# Altium footprint library CapacitorsTHD.PcbLib: 46 footprints (part 1 of 3)
Each footprint in its own frame and in the unit in brackets; x right, y up, seen from the top. Pads: shape width x height; smd on the part's side, far side on the other; paste and mask are expansions set on the pad; w line width, h text height; cw(c..) or ccw(c..) is an arc to the next point about the centre after c.
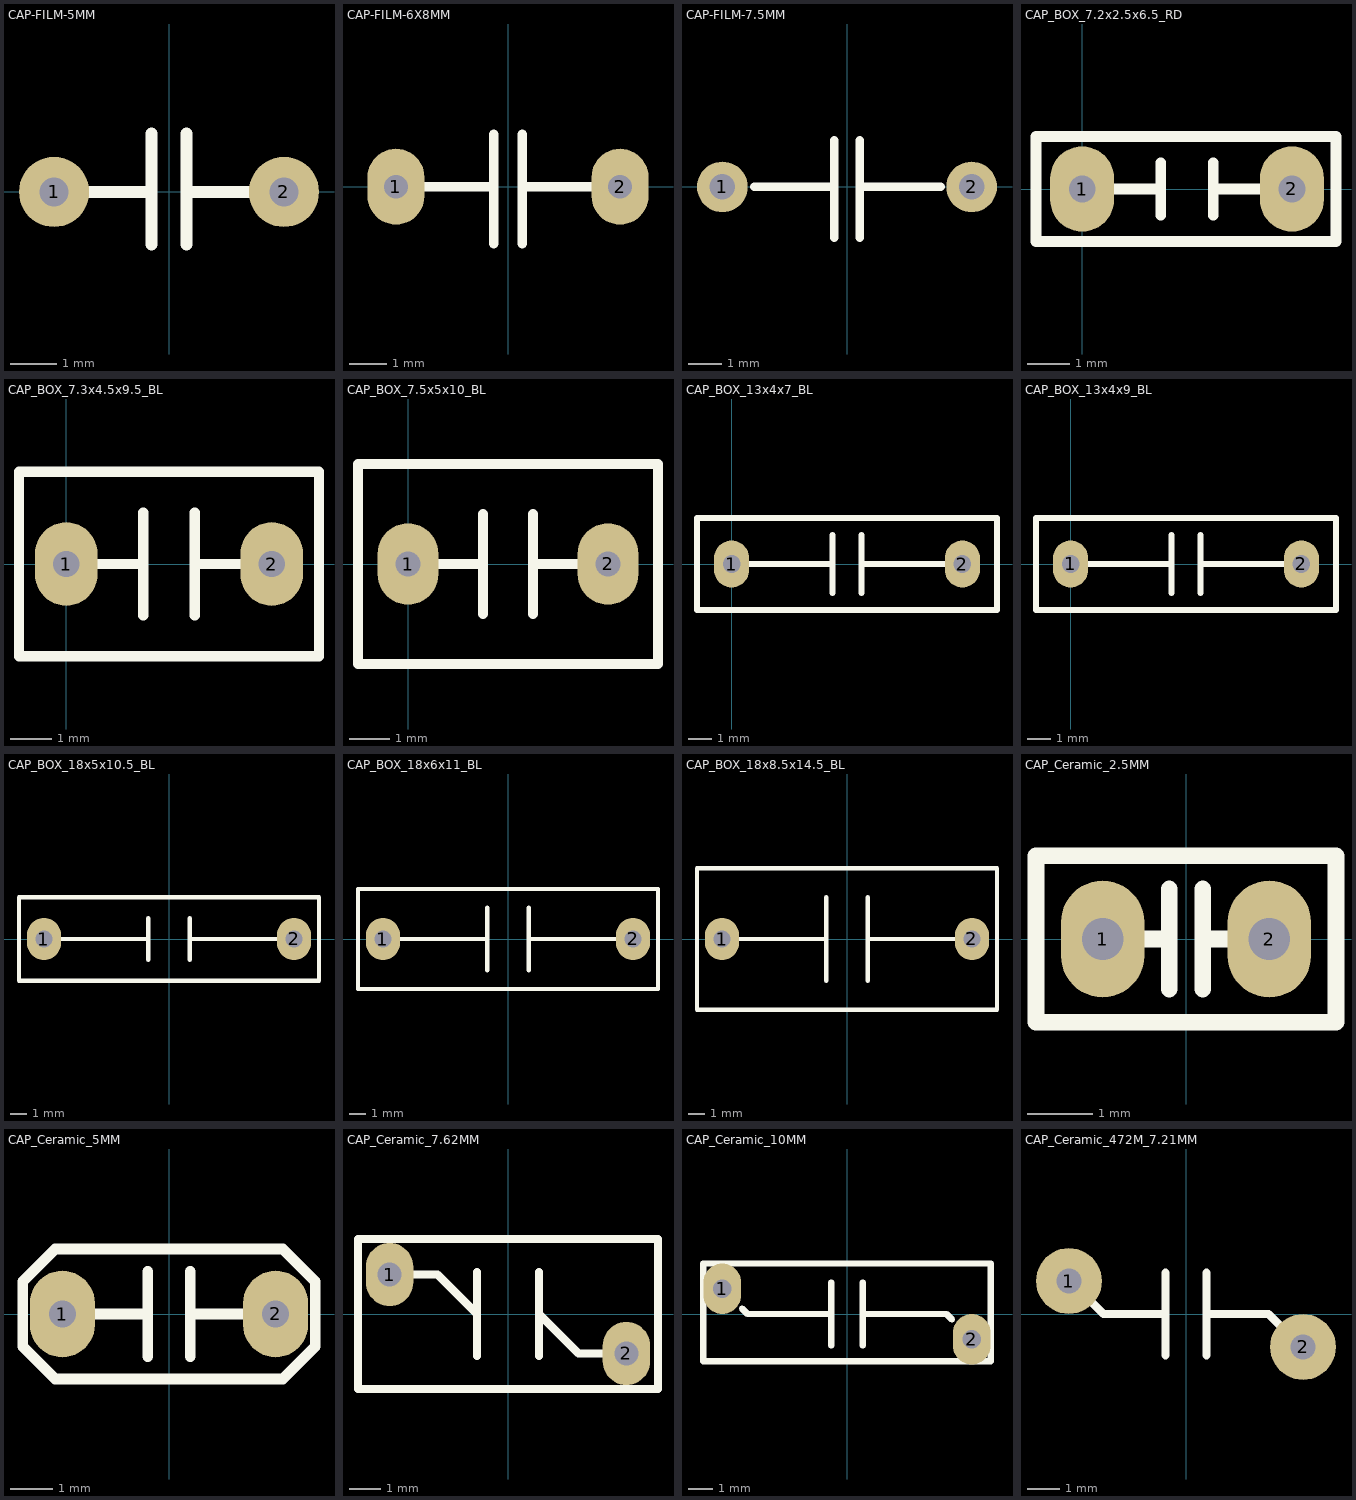
[diagram p0: the footprints below, top view; thin cyan lines are the x and y axes]

## CAP-FILM-5MM [mil]
pads (2):
  round 60 hole 25: 1(-98.43,0) 2(98.43,0)
Top Overlay:
  lines w10: -90,0 -20,0 ; -15,-45 -15,50 ; 15,-45 15,50 ; 20,0 90,0
3D body "102J.STEP": height 463.39, standoff -343.7, extent -127.95,-58.89 127.95,58.88

## CAP-FILM-6X8MM [mil]
pads (2):
  oval 60x80 hole 25: 1(-118,0) 2(118,0)
Top Overlay:
  lines w10: -90,0 -20,0 ; -15,-60 -15,55 ; 15,-60 15,55 ; 20,0 90,0
3D body "User Library-Film Capacitor 6x8mm.STEP": height 522.33, standoff -146.16, extent -157.48,-80 157.48,77.48

## CAP-FILM-7.5MM [mil]
pads (2):
  round 60 hole 30: 1(-147.64,0) 2(147.64,0)
Top Overlay:
  lines w10: -110,0 -20,0 ; -15,-60 -15,55 ; 15,-60 15,55 ; 20,0 111,0
3D body "473J.STEP": height 520, standoff -346.14, extent -206.69,-118.1 206.7,118.12

## CAP_BOX_7.2x2.5x6.5_RD [mil]
pads (2):
  oval 60x80 hole 25: 1(0,0) 2(196.85,0.01)
Top Overlay:
  lines w10: 24.61,0 73.82,0 ; 73.82,-24.61 73.82,24.61 ; 123.03,-24.61 123.03,24.61 ; 123.03,0 172.24,0 ; -43.31,-49.21 -43.31,49.21 238.19,49.21 238.19,-49.21 -43.31,-49.21
3D body "CAP_BOX_7.2x2.5x6.5_RD.stp": height 255.91, standoff -98.43, extent -43.3,-49.21 240.16,49.22

## CAP_BOX_7.3x4.5x9.5_BL [mil]
pads (2):
  oval 60x80 hole 25: 1(0,0) 2(196.85,0)
Top Overlay:
  lines w10: 24.61,0 73.82,0 ; 73.82,-49.21 73.82,49.21 ; 123.03,-49.21 123.03,49.21 ; 123.03,0 172.24,0 ; -45.28,-88.58 242.13,-88.58 242.13,88.58 -45.28,88.58 -45.28,-88.58
3D body "CAP_BOX_7.3x4.5x9.5_BL.stp": height 374.02, standoff -98.43, extent -45.27,-88.58 242.13,88.59

## CAP_BOX_7.5x5x10_BL [mil]
pads (2):
  oval 60x80 hole 25: 1(0,0) 2(196.85,0.01)
Top Overlay:
  lines w10: 24.61,0 73.82,0 ; 73.82,-49.21 73.82,49.21 ; 123.03,-49.21 123.03,49.21 ; 123.03,0 172.24,0 ; -49.21,-98.43 -49.21,98.43 246.06,98.43 246.06,-98.43 -49.21,-98.43
3D body "CAP_BOX_7.5x5x10_BL.stp": height 393.7, standoff -98.43, extent -49.21,-98.42 246.07,98.43

## CAP_BOX_13x4x7_BL [mil]
pads (2):
  oval 60x80 hole 30: 1(0,0) 2(393.7,0)
Top Overlay:
  lines w10: 24.61,0 172.24,0 ; 172.24,-49.21 172.24,49.21 ; 221.46,-49.21 221.46,49.21 ; 221.46,0 369.09,0 ; -59.06,-78.74 -59.06,78.74 452.76,78.74 452.76,-78.74 -59.06,-78.74
3D body "CAP_BOX_13x4x7_BL.stp": height 275.59, standoff -98.43, extent -59.05,-78.73 452.76,78.74

## CAP_BOX_13x4x9_BL [mil]
pads (2):
  oval 60x80 hole 30: 1(0,0) 2(393.7,0.01)
Top Overlay:
  lines w10: 24.61,0 172.24,0 ; 172.24,-49.21 172.24,49.21 ; 221.46,-49.21 221.46,49.21 ; 221.46,0 393.7,0.01 ; -59.06,-78.74 452.76,-78.74 452.76,78.74 -59.06,78.74 -59.06,-78.74
3D body "CAP_BOX_13x4x9_BL.stp": height 354.33, standoff -98.43, extent -59.05,-78.73 452.76,78.75

## CAP_BOX_18x5x10.5_BL [mil]
pads (2):
  oval 80x100 hole 40: 1(-295.28,0) 2(295.28,0)
Top Overlay:
  lines w10: -270.67,0 -49.21,0 ; -49.21,-49.21 -49.21,49.21 ; 49.21,-49.21 49.21,49.21 ; 49.21,0 270.67,0 ; -354.33,-98.43 -354.33,98.43 354.33,98.43 354.33,-98.43 -354.33,-98.43
3D body "CAP_BOX_18x5x10.5_BL.stp": height 413.39, standoff -98.43, extent -354.33,-98.42 354.34,98.43

## CAP_BOX_18x6x11_BL [mil]
pads (2):
  oval 80x100 hole 40: 1(-295.28,0) 2(295.28,0)
Top Overlay:
  lines w10: -270.67,0 -49.21,0 ; -49.21,-73.82 -49.21,73.82 ; 49.21,-73.82 49.21,73.82 ; 49.21,0 270.67,0 ; -354.33,-118.11 354.33,-118.11 354.33,118.11 -354.33,118.11 -354.33,-118.11
3D body "CAP_BOX_18x6x11_BL.stp": height 433.07, standoff -98.43, extent -354.33,-118.11 354.33,118.11

## CAP_BOX_18x8.5x14.5_BL [mil]
pads (2):
  oval 80x100 hole 40: 1(-295.27,0) 2(295.27,0)
Top Overlay:
  lines w10: -270.67,0 -49.21,0 -49.21,-98.43 ; -49.21,-73.82 -49.21,98.43 ; 49.21,-98.43 49.21,98.43 ; 49.21,0 270.67,0 ; -354.33,-167.32 354.33,-167.32 354.33,167.32 -354.33,167.32 -354.33,-167.32
3D body "CAP_BOX_18x8.5x14.5_BL.stp": height 570.87, standoff -98.43, extent -354.32,-167.32 354.34,167.32

## CAP_Ceramic_2.5MM [mil]
pads (2):
  oval 50x70 hole 25: 1(-50,0) 2(50,0)
Top Overlay:
  lines w10: -30,0 -10,0 ; -10,-30 -10,30 ; 10,-30 10,30 ; 10,0 30,0 ; -90,-50 -90,50 90,50 90,-50 -90,-50
3D body "10pF Ceramic Disc 2.SLDPRT": height 289.36, standoff -263.13, extent -92.29,-49.21 92.31,49.22

## CAP_Ceramic_5MM [mil]
pads (2):
  oval 60x80 hole 25: 1(-98.43,0) 2(98.43,0)
Top Overlay:
  lines w10: -78.74,0 -19.68,0 ; -19.68,-39.37 -19.68,39.37 ; 19.68,-39.37 19.68,39.37 ; 19.68,0 78.74,0 ; -135,-30 -135,30 -105,60 105,60 135,30 135,-30 105,-60 -105,-60 -135,-30
3D body "CAP_DISC_4x3_YL-LM.stp": height 216.31, standoff -98.43, extent -109.77,-59.05 109.78,59.06

## CAP_Ceramic_7.62MM [mil]
pads (2):
  oval 60x80 hole 30: 1(-150,50) 2(150,-50)
Top Overlay:
  lines w10: -150,50 -89.37,50 -39.37,0 ; -39.37,-53.15 -39.37,53.15 ; 39.37,-53.15 39.37,53.15 ; 39.37,0 89.37,-50 150,-50 ; -190,-95 190,-95 190,95 -190,95 -190,-95
3D body "CAP_DISC_9x3_BL.stp": height 456.67, standoff -114.17, extent -183.19,-83.39 183.21,83.4

## CAP_Ceramic_10MM [mil]
pads (2):
  oval 60x80 hole 30: 1(-197.5,40) 2(197.5,-40)
Top Overlay:
  lines w10: -166.25,8.75 -157.5,0 -25,0 ; -25,-50 -25,50 ; 25,-50 25,50 ; 25,0 157.5,0 166.25,-8.75 ; -227.5,-75 -227.5,80 227.5,80 227.5,-75 -227.5,-75
3D body "cdisk_p10x2_d11_th4.stp": height 511.81, standoff -157.48, extent -227.5,-77.48 229.19,80

## CAP_Ceramic_472M_7.21MM [mil]
pads (2):
  round 80 hole 30: 1(-142,40) 2(142,-40)
Top Overlay:
  lines w10: -125,25 -100,0 -25,0 ; -25,-50 -25,50 ; 25,50 25,-50 25,0 75,0 100,0 125,-25
3D body "User Library-Y2222.STEP": height 318.9, standoff -137.8, extent -153.54,-82.67 153.55,82.68